# Altium footprint library NX Module baseboard.PcbLib: 96 footprints (part 5 of 6)
Each footprint in its own frame and in the unit in brackets; x right, y up, seen from the top. Pads: shape width x height; smd on the part's side, far side on the other; paste and mask are expansions set on the pad; w line width, h text height; cw(c..) or ccw(c..) is an arc to the next point about the centre after c.
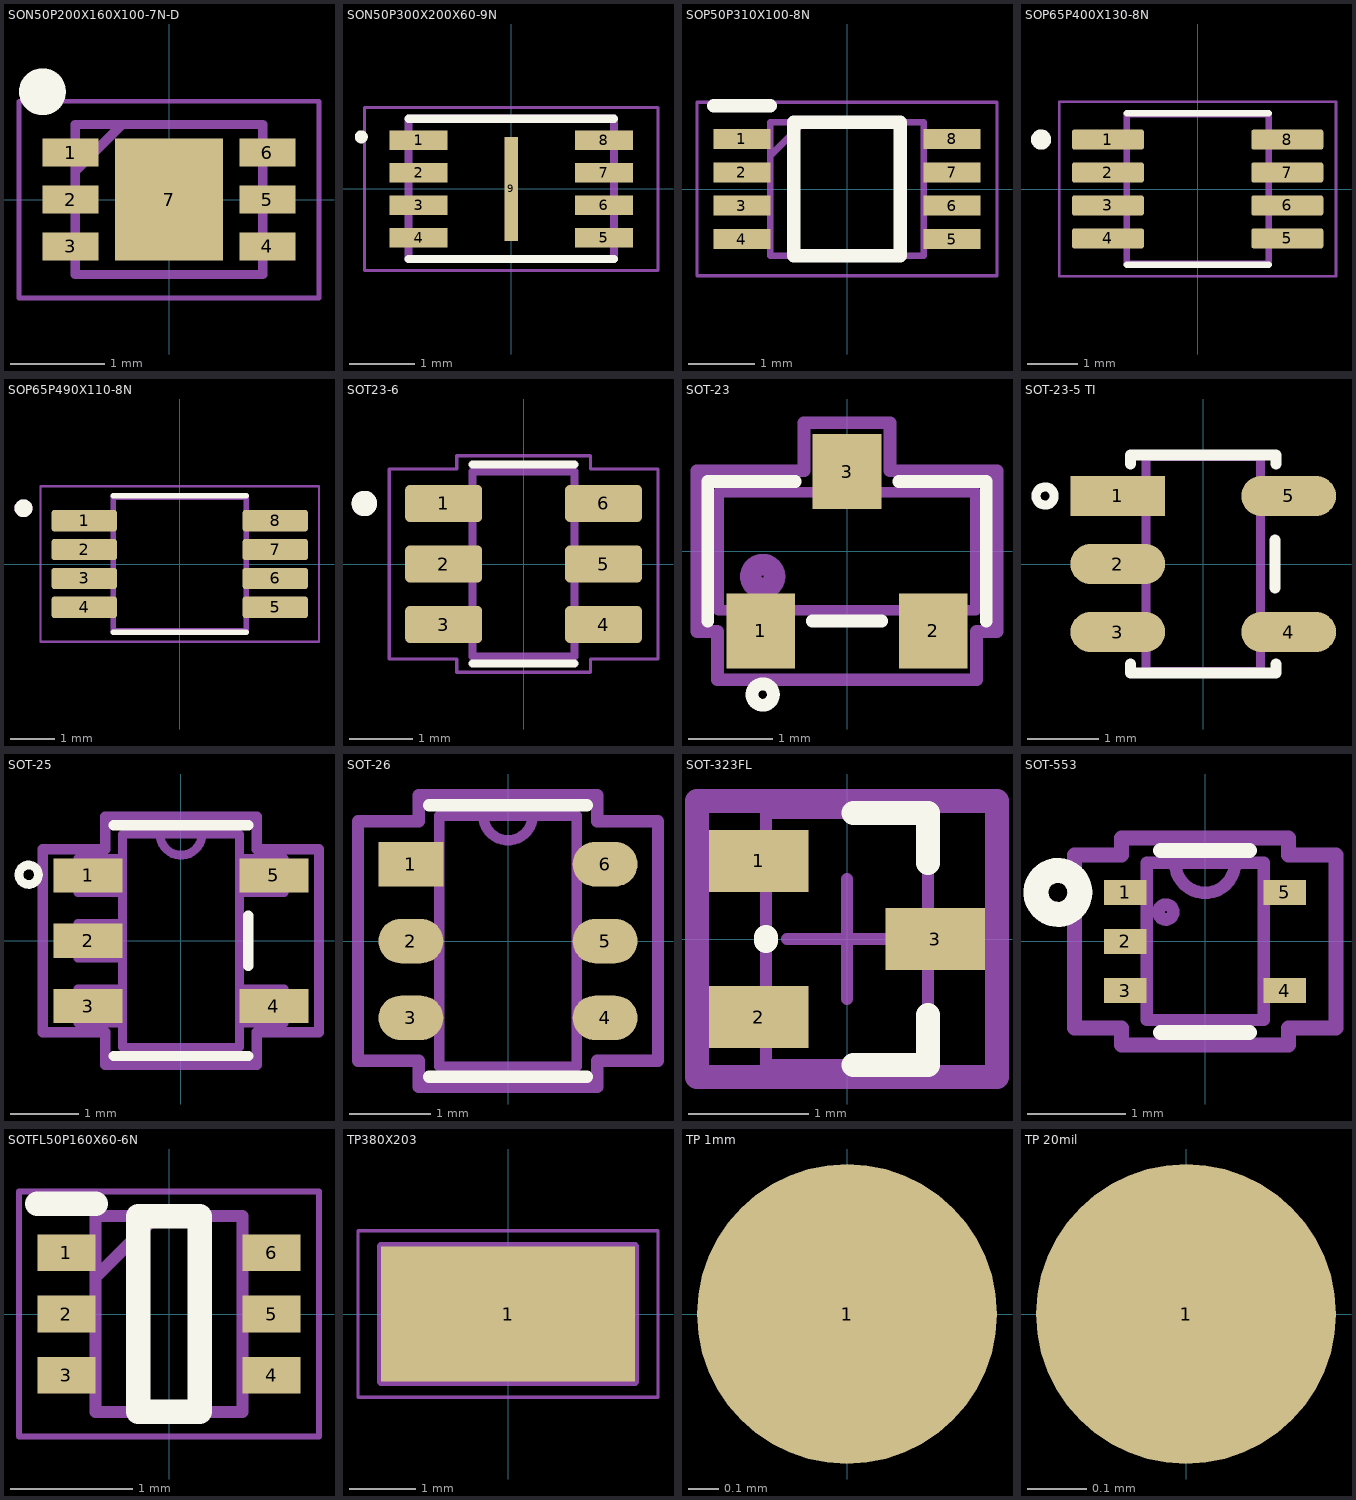
[diagram p4: the footprints below, top view; thin cyan lines are the x and y axes]

## SON50P200X160X100-7N-D [mm]
pads (7):
  rect 0.6x0.3 smd mask+0.051: 1(-1.05,0.5) 2(-1.05,0) 3(-1.05,-0.5) 4(1.05,-0.5) 5(1.05,0) 6(1.05,0.5)
  rect 1.15x1.3 smd mask+0.051: 7(0,0)
Top Overlay:
  circle w0.25: c-1.35,1.15 r0.125
Mechanical 13:
  lines w0.1: -1,0.3 -0.5,0.8 ; -1,-0.8 1,-0.8 1,0.8 -1,0.8 -1,-0.8
  text ".Designator" at -0.504,-0.363 h1.52
Mechanical 15:
  lines w0.05: -1.6,-1.05 1.6,-1.05 1.6,1.05 -1.6,1.05 -1.6,-1.05
3D body "NCP349MNAETBG.stp": height 1, standoff 0, extent -1.05,-0.8 1.05,0.8

## SON50P300X200X60-9N [mm]
pads (9):
  rect 0.89x0.3 smd mask+0.051: 1(-1.42,0.75) 2(-1.42,0.25) 3(-1.42,-0.25) 4(-1.42,-0.75) 5(1.42,-0.75) 6(1.42,-0.25) 7(1.42,0.25) 8(1.42,0.75)
  rect 0.2x1.6 smd mask+0.051: 9(0,0)
Top Overlay:
  circle w0.1: c-2.3,0.8 r0.05
  lines w0.127: -1.575,-1.075 1.575,-1.075 ; -1.575,1.075 1.575,1.075
Mechanical 13:
  lines w0.127: -1.575,-1.075 -1.575,1.075 1.575,1.075 1.575,-1.075 -1.575,-1.075
  text ".Designator" at -1.708,-0.054 h0.8
Mechanical 15:
  lines w0.05: -2.25,-1.25 2.25,-1.25 2.25,1.25 -2.25,1.25 -2.25,-1.25
3D body: height 0.6, standoff 0, extent -1.563,-1.064 1.563,1.064

## SOP50P310X100-8N [mm]
pads (8):
  rect 0.85x0.3 smd: 1(-1.575,0.75) 2(-1.575,0.25) 3(-1.575,-0.25) 4(-1.575,-0.75) 5(1.575,-0.75) 6(1.575,-0.25) 7(1.575,0.25) 8(1.575,0.75)
Top Overlay:
  lines w0.2: -2,1.25 -1.15,1.25 ; -0.8,-1 -0.8,1 0.8,1 0.8,-1 -0.8,-1
Mechanical 13:
  lines w0.1: -1.15,0.5 -0.65,1 ; -1.15,-1 -1.15,1 1.15,1 1.15,-1 -1.15,-1
Mechanical 15:
  lines w0.05: -2.25,-1.3 -2.25,1.3 2.25,1.3 2.25,-1.3 -2.25,-1.3
3D body "LSF0102DCH.stp": height 0.8, standoff 0, extent -1.559,-0.95 1.554,1.05

## SOP65P400X130-8N [mm]
pads (8):
  rrect25% 1.42x0.4 smd mask+0.051: 1(-1.77,0.975) 2(-1.77,0.325) 3(-1.77,-0.325) 4(-1.77,-0.975) 5(1.77,-0.975) 6(1.77,-0.325) 7(1.77,0.325) 8(1.77,0.975)
Top Overlay:
  circle w0.2: c-3.09,0.975 r0.1
  lines w0.127: -1.4,-1.495 1.4,-1.495 ; -1.4,1.495 1.4,1.495
Mechanical 13:
  lines w0.127: -1.4,-1.475 -1.4,1.475 1.4,1.475 1.4,-1.475 -1.4,-1.475
  text ".Designator" at -0.366,-0.197 h0.8
Mechanical 15:
  lines w0.05: -2.73,-1.725 -2.73,1.725 2.73,1.725 2.73,-1.725 -2.73,-1.725
3D body "PCA9306DCTR--3DModel-STEP-1.STEP": height 1.3, standoff 0, extent -2,-1.475 2,1.475

## SOP65P490X110-8N [mm]
pads (8):
  rrect25% 1.47x0.48 smd mask+0.051: 1(-2.15,0.975) 2(-2.15,0.325) 3(-2.15,-0.325) 4(-2.15,-0.975) 5(2.15,-0.975) 6(2.15,-0.325) 7(2.15,0.325) 8(2.15,0.975)
Top Overlay:
  circle w0.2: c-3.52,1.255 r0.1
  lines w0.127: -1.5,-1.535 1.5,-1.535 ; -1.5,1.535 1.5,1.535
Mechanical 13:
  circle w0.2: c-3.52,1.255 r0.1
  lines w0.127: -1.5,-1.5 -1.5,1.5 1.5,1.5 1.5,-1.5 -1.5,-1.5
  text ".Designator" at -0.421,-0.339 h1.27
Mechanical 15:
  lines w0.05: -3.135,-1.75 -3.135,1.75 3.135,1.75 3.135,-1.75 -3.135,-1.75
3D body "TCA9509DGKR.STEP": height 1.1, standoff 0, extent -2.45,-1.5 2.45,1.5

## SOT23-6 [mm]
pads (6):
  rrect25% 1.21x0.58 smd: 1(-1.255,0.95) 2(-1.255,0) 3(-1.255,-0.95) 4(1.255,-0.95) 5(1.255,0) 6(1.255,0.95)
Top Overlay:
  circle w0.2: c-2.5,0.95 r0.1
  lines w0.127: -0.8,-1.56 0.8,-1.56 ; -0.8,1.56 0.8,1.56
Top Courtyard:
  lines w0.05: -2.11,-1.49 -1.05,-1.49 -1.05,-1.7 1.05,-1.7 1.05,-1.49 2.11,-1.49 2.11,1.49 1.05,1.49 1.05,1.7 -1.05,1.7 -1.05,1.49 -2.11,1.49 -2.11,-1.49
Mechanical 13:
  circle w0.2: c-2.5,0.95 r0.1
  lines w0.127: -0.8,-1.45 0.8,-1.45 0.8,1.45 -0.8,1.45 -0.8,-1.45
  text ".Designator" at -0.084,-0.376 h1.27
3D body "step_temp.STEP": height 1.45, standoff 0, extent -1.4,-1.45 1.4,1.45

## SOT-23 [mil]
pads (3):
  rect 32x35 smd paste+0 mask+0: 1(-40.35,-37.2) 2(40.35,-37.2) 3(0,37.2)
Top Overlay:
  circle w6: c-39.37,-66.93 r5
  lines w6: -65.04,-32.56 -65.04,32.56 -24.14,32.56 ; -16.21,-32.56 16.21,-32.56 ; 24.14,32.56 65.04,32.56 65.04,-32.56
Mechanical 13:
  circle w10: c-39.37,-11.81 r5.57
  lines w1: -50.39,-27.56 -30.32,-27.56 ; -10.04,27.56 10.04,27.56 ; 30.32,-27.56 50.39,-27.56
  lines w5: -50.39,-27.56 -50.39,-49.21 -30.32,-49.21 -30.32,-27.56 ; -10.04,27.56 -10.04,49.21 10.04,49.21 10.04,27.56 ; 30.32,-27.56 30.32,-49.21 50.39,-49.21 50.39,-27.56 ; -60.04,-27.56 -60.04,27.56 60.04,27.56 60.04,-27.56 -60.04,-27.56
  text ".Designator" at -11.46,-12.42 h50
Mechanical 15:
  lines w6: -60.39,-60 -60.39,-37.56 -70.04,-37.56 -70.04,37.56 -20.04,37.56 -20,60 ; -60,-60 60,-60 ; -20.04,60 20.04,60 20.04,37.56 70.04,37.56 70.04,-37.56 60.39,-37.56 60.39,-60
3D body "SC-74-3.stp": height 44.88, standoff 1.38, extent -57.09,-51.18 57.08,51.18

## SOT-23-5 TI [mil] "SOT-753"
height 57
pads (5):
  rect 52x22 smd mask+2: 1(-47,37.4)
  oval 52x22 smd mask+2: 2(-47,0) 3(-47,-37.4) 4(47,-37.4) 5(47,37.4)
Top Overlay:
  circle w5: c-87,37.4 r5
  lines w6: -40,-55 -40,-60 39,-60 ; -40,55 -40,60 ; -39,60 40,60 40,55 ; 39.5,-13.3 39.5,13.3 ; 40,-60 40,-55
Mechanical 13:
  lines w5: -31.5,-59.06 -31.5,59.06 31.5,59.06 31.5,-59.06 -31.5,-59.06
  text ".Designator" at -9.51,-14.7 h50
3D body "21-0057F.stp": height 57.09, standoff 0, extent -59.01,-59.01 59.02,59.02

## SOT-25 [mm]
pads (5):
  rect 1.006x0.5 smd paste+0 mask+0: 1(-1.353,0.95) 2(-1.353,0) 3(-1.353,-0.95) 4(1.353,-0.95) 5(1.353,0.95)
Top Overlay:
  circle w0.127: c-2.215,0.961 r0.141
  lines w0.152: -0.977,-1.677 0.977,-1.677 ; -0.977,1.677 0.977,1.677 ; 0.977,-0.367 0.977,0.367
Mechanical 13:
  lines w0.127: -0.305,1.55 ccw(c0,1.55) 0.305,1.55 ; -1.5,-1.2 -1.5,-0.7 -0.85,-0.7 -0.85,-1.2 -1.5,-1.2 ; -1.5,-0.25 -1.5,0.25 -0.85,0.25 -0.85,-0.25 -1.5,-0.25 ; -1.5,0.7 -1.5,1.2 -0.85,1.2 -0.85,0.7 -1.5,0.7 ; -0.85,-1.55 0.85,-1.55 0.85,1.55 -0.85,1.55 -0.85,-1.55 ; 0.85,-1.2 0.85,-0.7 1.5,-0.7 1.5,-1.2 0.85,-1.2 ; 0.85,0.7 0.85,1.2 1.5,1.2 1.5,0.7 0.85,0.7
  text ".Designator" at -0.566,-0.078 h1.27
Mechanical 15:
  lines w0.152: -2.008,-1.331 -1.104,-1.331 -1.104,-1.804 1.104,-1.804 1.104,-1.331 2.008,-1.331 2.008,1.331 1.104,1.331 1.104,1.804 -1.104,1.804 -1.104,1.331 -2.008,1.331 -2.008,-1.331
3D body "SOT25_DIO.step": height 1.45, standoff 0, extent -1.5,-1.55 1.5,1.55

## SOT-26 [mm]
pads (6):
  rect 0.8x0.55 smd paste+0 mask+0: 1(-1.2,0.95)
  oval 0.8x0.55 smd paste+0 mask+0: 2(-1.2,0) 3(-1.2,-0.95) 4(1.2,-0.95) 5(1.2,0) 6(1.2,0.95)
Top Overlay:
  lines w0.152: -0.977,-1.677 0.977,-1.677 ; -0.977,1.677 0.977,1.677
Mechanical 13:
  lines w0.127: -0.305,1.55 ccw(c0,1.55) 0.305,1.55 ; -0.85,-1.55 -0.85,1.55 0.85,1.55 0.85,-1.55 -0.85,-1.55
  text ".Designator" at -0.201,-0.379 h1.27
Mechanical 15:
  lines w0.152: -1.854,-1.479 -1.104,-1.479 -1.104,-1.804 1.104,-1.804 1.104,-1.479 1.854,-1.479 1.854,1.479 1.104,1.479 1.104,1.804 -1.104,1.804 -1.104,1.479 -1.854,1.479 -1.854,-1.479
3D body "SOT26_DIO.step": height 1.3, standoff 0, extent -1.25,-1.55 1.25,1.55

## SOT-323FL [mm]
pads (3):
  rect 0.83x0.52 smd paste+0 mask+0.05: 1(-0.735,0.65) 2(-0.735,-0.65) 3(0.735,0)
Top Overlay:
  lines w0.2: -0.675,-0.015 -0.675,0.015 ; 0.055,-1.05 0.675,-1.05 0.675,-0.635 ; 0.055,1.05 0.675,1.05 0.675,0.635
Mechanical 13:
  lines w0.102: -0.675,-1.05 0.675,-1.05 0.675,1.05 -0.675,1.05 -0.675,-1.05
  text ".Designator" at -0.248,0.517 h0.8
Mechanical 15:
  lines w0.1: -0.5,0 0.5,0 ; 0,-0.5 0,0.5
  lines w0.2: -1.25,-1.15 1.25,-1.15 ; -1.25,-1.15 -1.25,1.15 ; -1.25,-1.15 -1.25,1.15 ; -1.25,-1.15 1.25,-1.15 ; -1.25,1.15 1.25,1.15 ; -1.25,1.15 1.25,1.15 ; 1.25,-1.15 1.25,1.15 ; 1.25,-1.15 1.25,1.15
3D body "Trans_Rohm_RU1J002YNTCL_eec.STEP": height 1.06, standoff 0, extent -1.05,-1 1.05,1

## SOT-553 [mil]
pads (5):
  rect 17x10 smd paste+0 mask+0: 1(-32,19.68) 2(-32,0) 3(-32,-19.68) 4(32,-19.68) 5(32,19.68)
Top Overlay:
  circle w10: c-59.06,19.68 r8.8
  lines w6: -17.84,-36.5 17.84,-36.5 ; -17.84,36.5 17.84,36.5
Mechanical 13:
  circle w5: c-15.75,11.81 r3
  lines w5: -12,31.5 ccw(c0,31.5) 12,31.5 ; -23.5,-31.5 23.5,-31.5 23.5,31.5 -23.5,31.5 -23.5,-31.5
  text ".Designator" at -11.38,-14.74 h60
Mechanical 15:
  lines w6: -52.5,-34.69 -33.5,-34.69 -33.5,-41.5 33.5,-41.5 33.5,-34.69 52.5,-34.69 52.5,34.69 33.5,34.69 33.5,41.5 -33.5,41.5 -33.5,34.69 -52.5,34.69 -52.5,-34.69
3D body "ESV_z90.stp": height 21.65, standoff 0, extent -31.49,-31.49 31.5,31.5

## SOTFL50P160X60-6N [mm]
pads (6):
  rect 0.475x0.3 smd: 1(-0.838,0.5) 2(-0.838,0) 3(-0.838,-0.5) 4(0.838,-0.5) 5(0.838,0) 6(0.838,0.5)
Top Overlay:
  lines w0.2: -1.075,0.9 -0.6,0.9 ; -0.25,-0.8 0.25,-0.8 0.25,0.8 -0.25,0.8 -0.25,-0.8
Mechanical 13:
  lines w0.1: -0.6,0.3 -0.1,0.8 ; -0.6,-0.8 0.6,-0.8 0.6,0.8 -0.6,0.8 -0.6,-0.8
  text ".Designator" at 0.369,-0.319 h1.27
Mechanical 15:
  lines w0.05: -1.225,-1 -1.225,1 1.225,1 1.225,-1 -1.225,-1
3D body "TLV62568ADRLR.stp": height 0.6, standoff 0, extent -0.8,-0.8 0.8,0.8

## TP380X203 [mil]
pads (1):
  rect 150x80 smd: 1(0,0)
Mechanical 13:
  lines w5: -75,-40 75,-40 75,40 -75,40 -75,-40
  text ".Designator" at -13.52,-13.21 h60
Mechanical 15:
  lines w1.97: -88.58,-49.21 -88.58,49.21 88.58,49.21 88.58,-49.21 -88.58,-49.21
3D body "5019--3DModel-STEP-56544.STEP": height 90, standoff 0, extent -75,-39.96 75,39.96

## TP 1mm [mm] "1 mm Probe Pad"
pads (1):
  round 1 smd: 1(0,0)

## TP 20mil [mil] "1 mm Probe Pad"
pads (1):
  round 20 smd mask+2: 1(0,0)